# Altium footprint library Connectors.PcbLib: 68 footprints (part 5 of 5)
Each footprint in its own frame and in the unit in brackets; x right, y up, seen from the top. Pads: shape width x height; smd on the part's side, far side on the other; paste and mask are expansions set on the pad; w line width, h text height; cw(c..) or ccw(c..) is an arc to the next point about the centre after c.
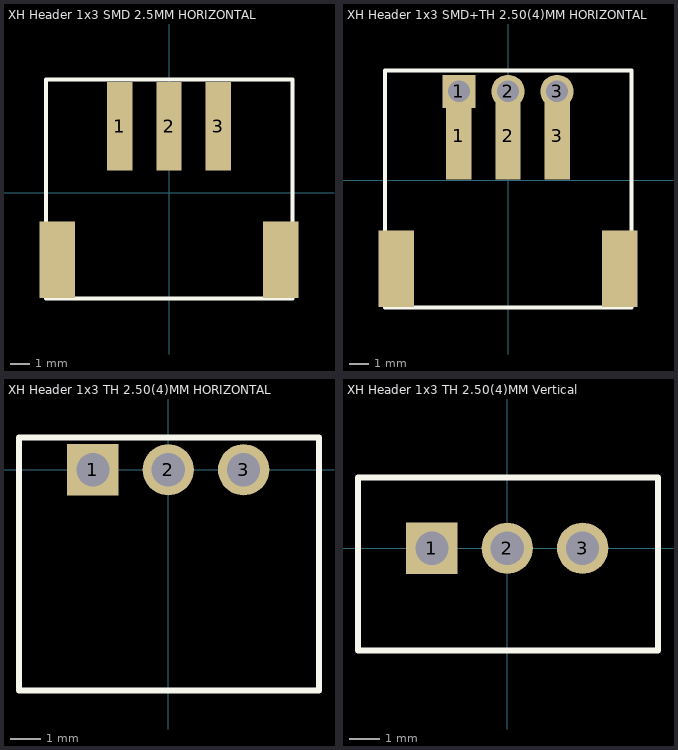
[diagram p4: the footprints below, top view; thin cyan lines are the x and y axes]

## XH Header 1x3 SMD 2.5MM HORIZONTAL [mm] "S3B-XH-A(LF)(SN)"
pads (5):
  rect 1.3x4.5 smd: 1(-2.5,3.4) 2(0,3.4) 3(2.5,3.4)
  rect 1.8x3.9 smd: ""(-5.7,-3.4) ""(5.7,-3.4)
Top Overlay:
  lines w0.2: -6.275,-5.375 -6.275,5.775 6.3,5.775 6.3,-5.375 -6.275,-5.375
3D body "S3B-XH-SM4-TB.step": height 6, standoff 0, extent -6.25,-5.35 6.25,4.65

## XH Header 1x3 SMD+TH 2.50(4)MM HORIZONTAL [mm] "S3B-XH-A(LF)(SN)/S3B-XH-SM4-TB(LF)(SN)"
pads (8):
  rect 1.3x4.5 smd: 1(-2.5,2.275) 2(0,2.275) 3(2.5,2.275)
  rect 1.7x1.7 hole 1.1: 1(-2.5,4.525)
  round 1.7 hole 1.1: 2(0,4.525) 3(2.5,4.525)
  rect 1.8x3.9 smd: ""(-5.7,-4.525) ""(5.7,-4.525)
Top Overlay:
  lines w0.2: -6.275,-6.5 -6.275,5.6 6.3,5.6 6.3,-6.5 -6.275,-6.5
3D body "S3B-XH-SM4-TB.step": height 6, standoff 0, extent -6.25,-6.475 6.25,3.525

## XH Header 1x3 TH 2.50(4)MM HORIZONTAL [mm] "S3B-XH-A(LF)(SN)"
pads (3):
  rect 1.7x1.7 hole 1.1: 1(-2.5,0)
  round 1.7 hole 1.1: 2(0,0) 3(2.5,0)
Top Overlay:
  lines w0.2: -4.95,-7.325 -4.95,1.075 5,1.075 5,-7.325 -4.95,-7.325
3D body "CWF-3RB.step": height 5.75, standoff -3.5, extent -4.95,-7.3 4.95,0.32

## XH Header 1x3 TH 2.50(4)MM Vertical [mm] "B3B-XH-A(LF)(SN)"
pads (3):
  rect 1.7x1.7 hole 1.1: 1(-2.5,0)
  round 1.7 hole 1.1: 2(0,0) 3(2.5,0)
Top Overlay:
  lines w0.2: -4.95,-3.4 -4.95,2.35 5,2.35 5,-3.4 -4.95,-3.4
3D body "B3B-XH-AM.step": height 7, standoff -3.5, extent -4.95,-3.4 4.95,2.35